# Altium footprint library LUMI_Handy_Soldering_LIB.PcbLib: 562 footprints (part 26 of 36)
Each footprint in its own frame and in the unit in brackets; x right, y up, seen from the top. Pads: shape width x height; smd on the part's side, far side on the other; paste and mask are expansions set on the pad; w line width, h text height; cw(c..) or ccw(c..) is an arc to the next point about the centre after c.
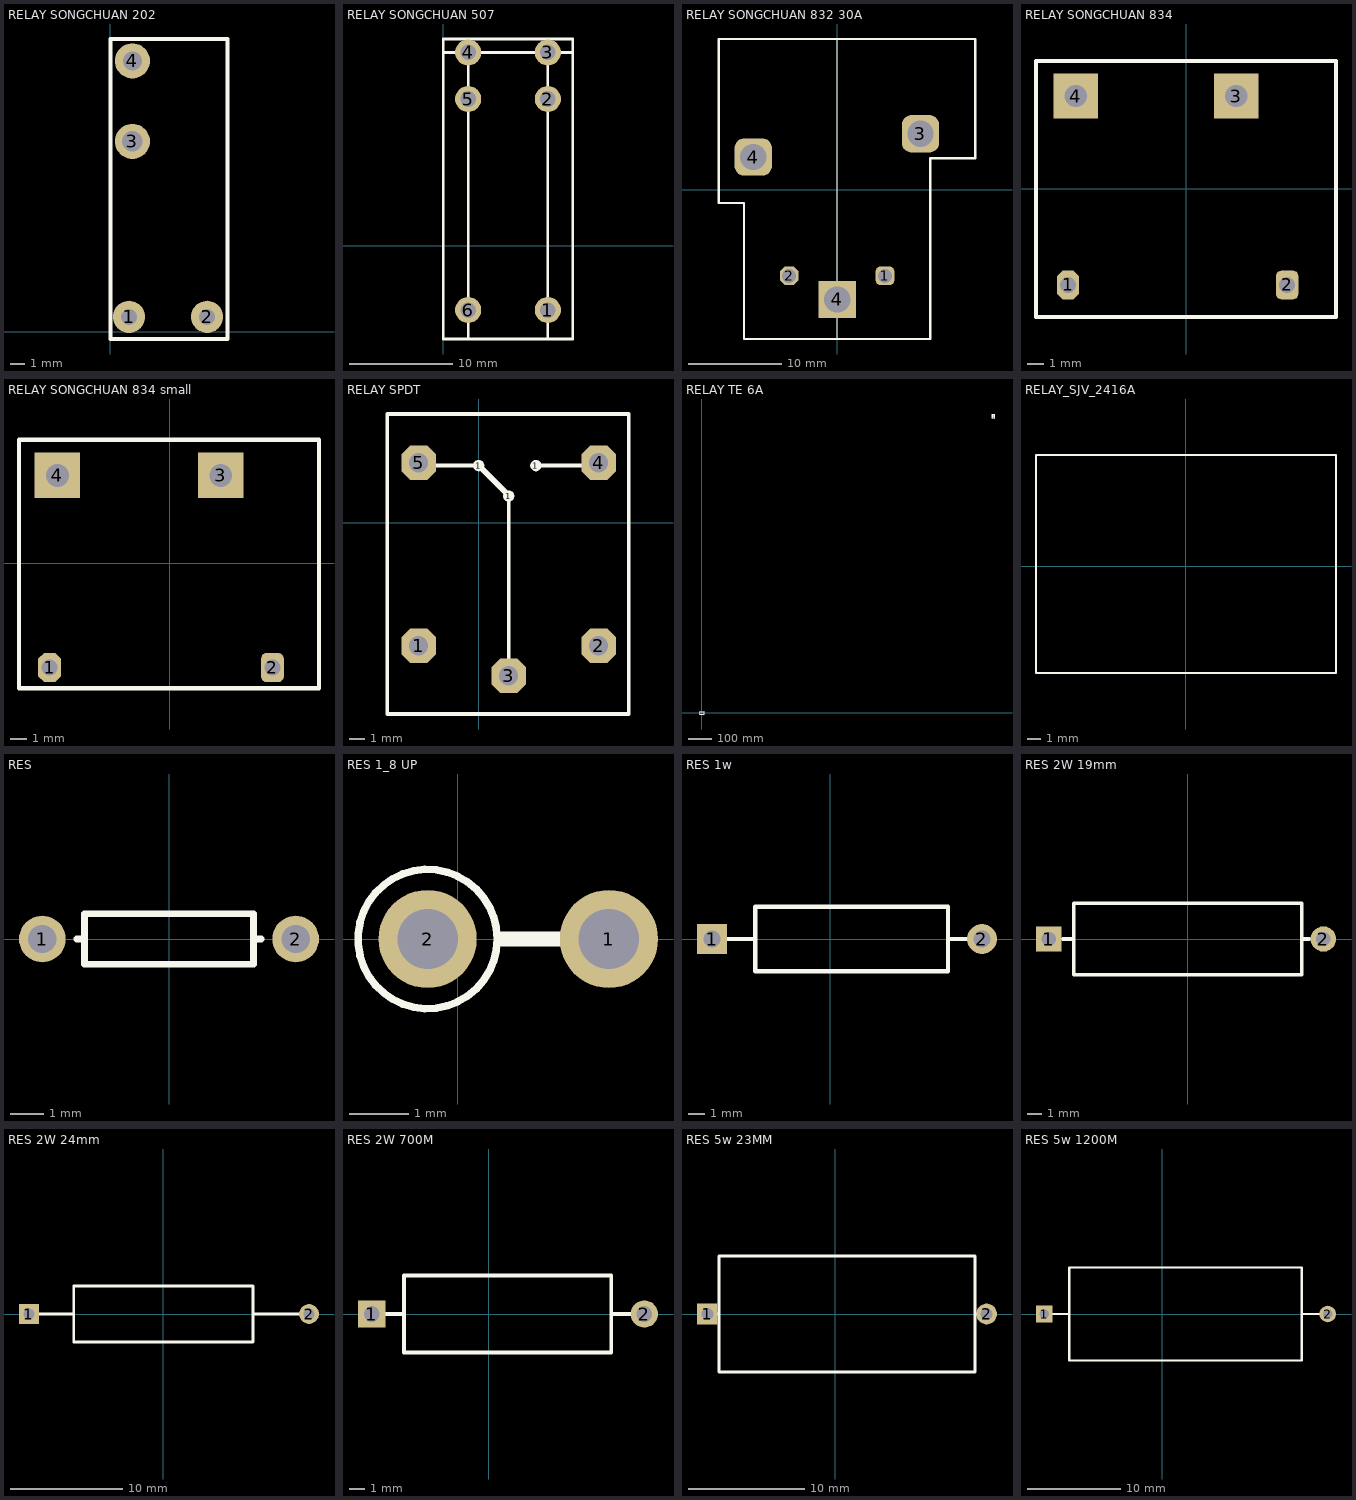
[diagram p25: the footprints below, top view; thin cyan lines are the x and y axes]

## RELAY SONGCHUAN 202 [mm]
pads (4):
  round 2.2 hole 1.1: 1(1.27,1.016) 2(6.604,1.016)
  round 2.4 hole 1.4: 3(1.5,13)
  round 2.4 hole 1.3: 4(1.5,18.5)
Top Overlay:
  lines w0.254: 0,-0.5 8,-0.5 8,20 0,20 0,-0.5
3D body: height 15.7, standoff 0.2, extent 0,-0.508 8,20
3D body: height 5, standoff -3, extent 0.576,0.318 1.97,1.715
3D body: height 5, standoff -3, extent 5.907,0.254 7.301,1.651
3D body: height 5, standoff -3, extent 0.806,12.302 2.2,13.699
3D body: height 5, standoff -3, extent 0.892,17.843 2.286,19.241

## RELAY SONGCHUAN 507 [mm]
pads (6):
  round 2.524 hole 1.5: 1(10.1,-6.2) 2(10.1,14.2) 3(10.1,18.7) 4(2.4,18.7) 5(2.4,14.2) 6(2.4,-6.2)
Top Overlay:
  lines w0.254: 0,18.7 12.5,18.7 ; 2.4,-9 2.4,18.7 2.4,19.9 ; 10.1,-9 10.1,18.7 10.1,20 ; 0,-9 0,20 12.5,20 12.5,-9 0,-9
3D body: height 5, standoff -3, extent 1.706,18.002 3.1,19.399
3D body: height 5, standoff -3, extent 1.706,13.502 3.1,14.899
3D body: height 5, standoff -3, extent 9.406,18.002 10.8,19.399
3D body: height 5, standoff -3, extent 9.406,13.502 10.8,14.899
3D body: height 5, standoff -3, extent 9.406,-6.898 10.8,-5.501
3D body: height 5, standoff -3, extent 1.706,-6.898 3.1,-5.501
3D body: height 15.7, standoff 0.2, extent 0,-9 12.5,20

## RELAY SONGCHUAN 832 30A [mm]
pads (5):
  rrect50% 2x2 hole 1.5: 1(5.127,-9.26)
  oct 2x2 hole 1.5: 2(-5.16,-9.26)
  rrect50% 4x4 hole 2.8: 3(8.937,5.98) 4(-9.011,3.481)
  rect 4x4 hole 2.8: 4(0,-11.8)
Top Overlay:
  lines w0.1: 0,-16.046 0,16.154
  lines w0.254: -12.7,-1.446 -12.7,16.154 14.8,16.154 14.8,3.354 10,3.354 10,-16.046 -10,-16.046 -10,-1.446 -12.7,-1.446
3D body: height 20.4, standoff 0.2, extent -12.7,-16.046 14.8,16.154
3D body: height 5, standoff -3, extent -5.541,-9.659 -4.744,-8.861
3D body: height 5, standoff -3, extent 4.73,-9.659 5.527,-8.861

## RELAY SONGCHUAN 834 [mm]
pads (4):
  oct 1.4x1.8 hole 1: 1(-7.4,-6)
  rrect50% 1.4x1.8 hole 1: 2(6.3,-6)
  rect 2.794x2.794 hole 1.4: 3(3.116,5.811) 4(-6.917,5.811)
Top Overlay:
  lines w0.254: -9.4,-7 -9.4,-4.46 ; -9.4,-8 9.35,-8 9.35,8 -9.4,8 -9.4,-8
3D body: height 5, standoff -3, extent -7.797,-6.399 -7,-5.601
3D body: height 11, standoff 0.2, extent -9.4,-8 9.35,8
3D body: height 5, standoff -3, extent 2.421,5.113 3.816,6.51
3D body: height 5, standoff -3, extent -7.612,5.113 -6.217,6.51
3D body: height 5, standoff -3, extent 5.916,-6.387 6.713,-5.588

## RELAY SONGCHUAN 834 small [mm]
pads (4):
  oct 1.4x1.8 hole 1: 1(-7.4,-6.4)
  rrect50% 1.4x1.8 hole 1: 2(6.3,-6.4)
  rect 2.794x2.794 hole 1.4: 3(3.116,5.411) 4(-6.917,5.411)
Top Overlay:
  lines w0.254: -9.28,-7.67 9.161,-7.67 9.161,7.6 -9.28,7.6 -9.28,-7.67
3D body: height 11, standoff 0.2, extent -9.375,-8 9.375,8
3D body: height 5, standoff -3, extent -7.797,-6.799 -7,-6.001
3D body: height 5, standoff -3, extent 2.421,4.713 3.816,6.11
3D body: height 5, standoff -3, extent -7.612,4.713 -6.217,6.11
3D body: height 5, standoff -3, extent 5.916,-6.787 6.713,-5.988

## RELAY SPDT [mil]
pads (8):
  oct 90x90 hole 50: 1(-157.48,-322.83) 2(314.96,-322.83) 3(78.74,-401.57) 4(314.96,157.48) 5(-157.48,157.48)
  round 30 on Top Overlay: 1(0,150) 1(78.74,70) 1(150,150)
Top Overlay:
  lines w10: -150,150 0,150 ; 78.74,-401.57 78.74,73.43 ; 150,150 300,150 ; -240,-501.97 -240,285.43 393.7,285.43 393.7,-501.97 -240,-501.97
  lines w15: 0,150 79.37,70.63
3D body: height 58.74, standoff -610.55, extent -236.22,-511.81 393.7,275.59

## RELAY TE 6A [mil]
pads (6):
  round 90 hole 50: 1(-360,150) 2(-360,-150) 3(40,150) 4(340,150)
  rrect50% 106.3x106.3 hole 62.99: 1(49598.43,50000)
  round 106.3 hole 62.99: 2(49401.57,50000)
Top Overlay:
  lines w5: -400,-200 387.4,-200 387.4,193.7 -400,193.7 -400,-200
  lines w10: 49300,50441.26 49700,50441.26 ; 49500,50039.37 49500,50748.03 ; 49300,50039.37 49700,50039.37 49700,50748.03 49300,50748.03 49300,50550 49300,50039.37
3D body: height 137.8, standoff -433.21, extent 49279.44,49980.73 49721.68,50768.2

## RELAY_SJV_2416A [mm]
Top Overlay:
  lines w0.127: -10.975,-7.825 11.025,-7.825 11.025,8.175 -10.975,8.175 -10.975,-7.825

## RES [mm] "Axial Device, Thru-Hole; 2 Leads; 0.3 in Pin Spacing"
height 1.524
pads (2):
  round 1.4 hole 0.85: 1(-3.81,0) 2(3.81,0)
Top Overlay:
  lines w0.2: -2.769,0 -2.54,0 ; 2.769,0 2.54,0 ; 2.54,0 2.54,-0.762 -2.54,-0.762 -2.54,0.762 2.54,0.762 2.54,0
3D body: height 2.09, standoff -1.91, extent -4.075,-1 4.025,1

## RES 1_8 UP [mil] "Axial Device, Thru-Hole; 2 Leads; 0.3 in Pin Spacing"
height 60
pads (2):
  round 65 hole 40: 1(100,0) 2(-20,0)
Top Overlay:
  circle w5: c-20,0 r46.1
  lines w10: 30,0 75,0 76,-1
3D body: height 368, standoff -45, extent -65.99,-46 110.01,46

## RES 1w [mil] "Axial Device, Thru-Hole; 2 Leads; 0.3 in Pin Spacing"
height 60
pads (2):
  rect 70x70 hole 40: 1(-275.59,0)
  round 70 hole 40: 2(354.33,0)
Top Overlay:
  lines w10: -275.59,0 -175,0 ; 275,0 354.33,0 ; -175,-75 275,-75 275,75 -175,75 -175,-75
3D body: height 218.58, standoff -47.17, extent -269.68,-88.58 348.43,88.59

## RES 2W 19mm [mil]
pads (2):
  rect 70x70 hole 40: 1(-383.86,0)
  round 70 hole 40: 2(374.02,0)
Top Overlay:
  lines w10: -344.49,0 -314.96,0 ; 314.96,0 334.65,0 ; -314.96,-98.43 314.96,-98.43 314.96,98.43 -314.96,98.43 -314.96,-98.43
3D body: height 198.43, standoff -116.54, extent -365.75,-98.42 365.75,98.43

## RES 2W 24mm [mil] "Axial Device, Thru-Hole; 2 Leads; 0.3 in Pin Spacing"
height 60
pads (2):
  rect 70x70 hole 40: 1(-472.44,0)
  round 70 hole 40: 2(511.81,0)
Top Overlay:
  lines w10: -472.44,0 -314.96,0 ; 314.96,0 511.81,0 ; -314.96,-98.43 314.96,-98.43 314.96,98.43 -314.96,98.43 -314.96,-98.43
3D body: height 348.43, standoff 33.46, extent -365.75,-98.42 365.75,98.43

## RES 2W 700M [mil] "Axial Device, Thru-Hole; 2 Leads; 0.3 in Pin Spacing"
height 60
pads (2):
  rect 70x70 hole 40: 1(-300,0)
  round 70 hole 40: 2(400,0)
Top Overlay:
  lines w10: -300,0 -216.54,0 ; 314.96,0 400,0 ; -216.54,-98.43 -216.54,98.43 314.96,98.43 314.96,-98.43 -216.54,-98.43
3D body: height 198.43, standoff -116.54, extent -317.75,-97 413.75,99.85

## RES 5w 23MM [mil] "Axial Device, Thru-Hole; 2 Leads; 0.3 in Pin Spacing"
height 60
pads (2):
  rect 70x70 hole 40: 1(-433.07,0)
  round 70 hole 40: 2(511.81,0)
Top Overlay:
  lines w10: -433.07,0 -393.7,0 ; 472.44,0 511.81,0 ; -393.7,-196.85 472.44,-196.85 472.44,196.85 -393.7,196.85 -393.7,-196.85

## RES 5w 1200M [mil] "Axial Device, Thru-Hole; 2 Leads; 0.3 in Pin Spacing"
height 60
pads (2):
  rect 70x70 hole 40: 1(-500,0)
  round 70 hole 40: 2(700,0)
Top Overlay:
  lines w10: -500,0 -393.7,0 ; 590.55,0 700,0 ; -393.7,-196.85 590.55,-196.85 590.55,196.85 -393.7,196.85 -393.7,-196.85
3D body: height 271.26, standoff -169.69, extent -510,-135.59 721.5,140